# Altium footprint library Connektor.PcbLib: 305 footprints (part 12 of 20)
Each footprint in its own frame and in the unit in brackets; x right, y up, seen from the top. Pads: shape width x height; smd on the part's side, far side on the other; paste and mask are expansions set on the pad; w line width, h text height; cw(c..) or ccw(c..) is an arc to the next point about the centre after c.
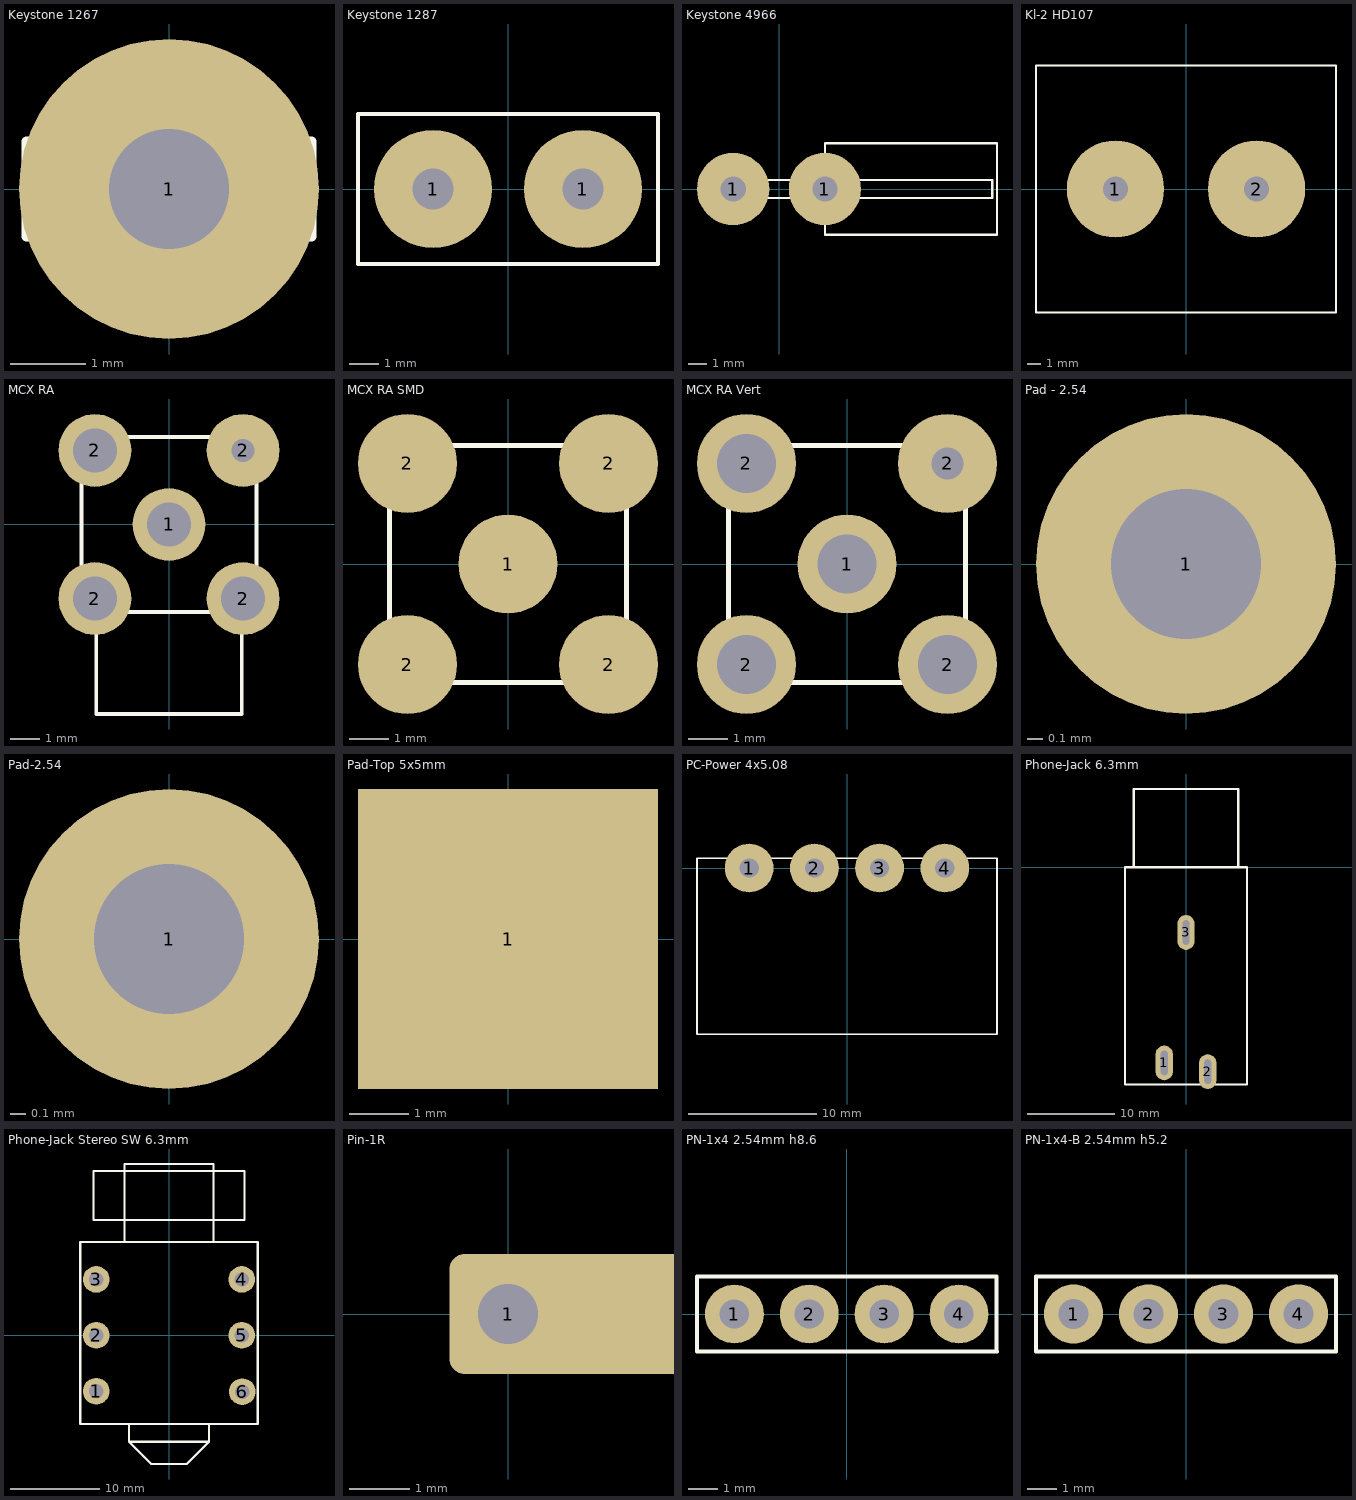
[diagram p11: the footprints below, top view; thin cyan lines are the x and y axes]

## Keystone 1267 [mm]
pads (1):
  round 4 hole 1.6: 1(0,0)
TopOverlay:
  lines w0.127: -1.905,-0.635 1.905,-0.635 1.905,0.635 -1.905,0.635 -1.905,-0.635
3D body: height 9.1, standoff -4.75, extent -2.014,-0.439 1.986,0.411

## Keystone 1287 [mm]
pads (2):
  round 4 hole 1.4: 1(-2.54,0) 1(2.54,0)
TopOverlay:
  lines w0.127: -5.08,-2.54 5.08,-2.54 5.08,2.54 -5.08,2.54 -5.08,-2.54
3D body: height 16.2, standoff -2.79, extent -3.96,-0.419 3.96,0.381

## Keystone 4966 [mm]
pads (2):
  round 4 hole 1.4: 1(-2.54,0) 1(2.54,0)
TopOverlay:
  lines w0.127: 2.54,-0.5 2.54,-2.54 12.065,-2.54 12.065,2.54 2.54,2.54 2.54,0.5 ; -3.5,-0.5 -3.5,0.5 11.8,0.5 11.8,-0.5 -3.5,-0.5
3D body: height 3.52, standoff -9.17, extent -3.302,-0.406 11.684,0.406

## Kl-2 HD107 [mm]
pads (2):
  round 7 hole 1.8: 1(-5.08,0) 2(5.08,0)
TopOverlay:
  lines w0.127: -10.795,-8.89 10.795,-8.89 10.795,8.89 -10.795,8.89 -10.795,-8.89

## MCX RA [mm]
pads (5):
  round 2.5 hole 1.5: 1(0,0) 2(-2.54,-2.54) 2(-2.54,2.54) 2(2.54,-2.54)
  round 2.5 hole 0.8: 2(2.54,2.54)
TopOverlay:
  lines w0.127: -2.5,-3 -2.5,-6.5 2.5,-6.5 2.5,-3 ; -3,-3 3,-3 3,3 -3,3 -3,-3
3D body: height 5.9, standoff -3.94, extent -3,-6.5 3,3

## MCX RA SMD [mm]
pads (5):
  round 2.5 smd: 1(0,0) 2(-2.54,-2.54) 2(-2.54,2.54) 2(2.54,-2.54) 2(2.54,2.54)
TopOverlay:
  lines w0.127: -3,-3 -3,3 3,3 3,-3 -3,-3
3D body: height 5.9, standoff 0, extent -2.95,-2.95 2.95,2.95

## MCX RA Vert [mm]
pads (5):
  round 2.5 hole 1.5: 1(0,0) 2(-2.54,-2.54) 2(-2.54,2.54) 2(2.54,-2.54)
  round 2.5 hole 0.8: 2(2.54,2.54)
TopOverlay:
  lines w0.127: -3,-3 3,-3 3,3 -3,3 -3,-3
3D body: height 5.5, standoff -1.6, extent -3,-3 3,3

## Pad - 2.54 [mm]
pads (1):
  round 2 hole 1: 1(0,0)

## Pad-2.54 [mm]
pads (1):
  round 2 hole 1: 1(0,0)

## Pad-Top 5x5mm [mm]
pads (1):
  rect 5.08x5.08 smd: 1(0,0)

## PC-Power 4x5.08 [mm]
pads (4):
  round 3.8 hole 1.5: 1(-7.62,0) 2(-2.54,0) 3(2.54,0) 4(7.62,0)
TopOverlay:
  lines w0.127: -11.684,-12.954 -11.684,0.762 11.684,0.762 11.684,-12.954 -11.684,-12.954
3D body: height 8.74, standoff -3.58, extent -11.633,-12.928 11.633,0.762

## Phone-Jack 6.3mm [mm]
pads (3):
  oval 2x4 hole 0.8 slot 2.8 at 90 deg: 1(-2.5,-22.5) 2(2.5,-23.5) 3(0,-7.5)
TopOverlay:
  lines w0.25: -6,0 -6,9 6,9 6,0 ; -7,-25 -7,0 7,0 7,-25 -7,-25
3D body: height 11, standoff 0, extent -7,-25 7,0

## Phone-Jack Stereo SW 6.3mm [mm] "SJ-6306"
pads (6):
  round 3 hole 1.6: 1(-8.2,-6.3) 2(-8.2,0) 3(-8.2,6.3) 4(8.2,6.3) 5(8.2,0) 6(8.255,-6.35)
TopOverlay:
  lines w0.25: -5,10.5 -5,19.3 5,19.3 5,10.5 ; -10,-10 10,-10 10,10.5 -10,10.5 -10,-10
  lines w0.254: -4.5,-10 -4.5,-12 ; 4.5,-10 4.5,-12 ; 6,-10 6.5,-10 ; -4.5,-12 -2,-14.5 2,-14.5 4.5,-12 ; -4.5,-12 4.5,-12 ; -8.5,13 8.5,13 8.5,18.5 -8.5,18.5 -8.5,13
3D body: height 20, standoff -3.85, extent -10.005,-13.575 9.895,18.425

## Pin-1R [mm]
pads (1):
  rrect25% 5x2 hole 1 copper offset 1.524,0: 1(0,0)
3D body: height 0.71, standoff -2, extent -0.325,-0.325 7,0.325

## PN-1x4 2.54mm h8.6 [mm]
pads (4):
  round 2 hole 1: 1(-3.81,0) 2(-1.27,0) 3(1.27,0) 4(3.81,0)
TopOverlay:
  lines w0.127: 5.08,-1.27 5.08,1.27 -5.08,1.27 -5.08,-1.27 5.1,-1.27
3D body: height 8.62, standoff -2.5, extent -5.08,-1.27 5.08,1.23

## PN-1x4-B 2.54mm h5.2 [mm]
pads (4):
  round 2 hole 1: 1(-3.81,0) 2(-1.27,0) 3(1.27,0) 4(3.81,0)
TopOverlay:
  lines w0.127: -5.08,-1.27 -5.08,1.27 5.08,1.27 5.08,-1.27 -5.08,-1.27
3D body: height 5.2, standoff -2.5, extent -5.08,-1.27 5.08,1.27